# Altium footprint library TranDangKhoa-LIB.PcbLib: 1435 footprints (part 2 of 90)
Each footprint in its own frame and in the unit in brackets; x right, y up, seen from the top. Pads: shape width x height; smd on the part's side, far side on the other; paste and mask are expansions set on the pad; w line width, h text height; cw(c..) or ccw(c..) is an arc to the next point about the centre after c.
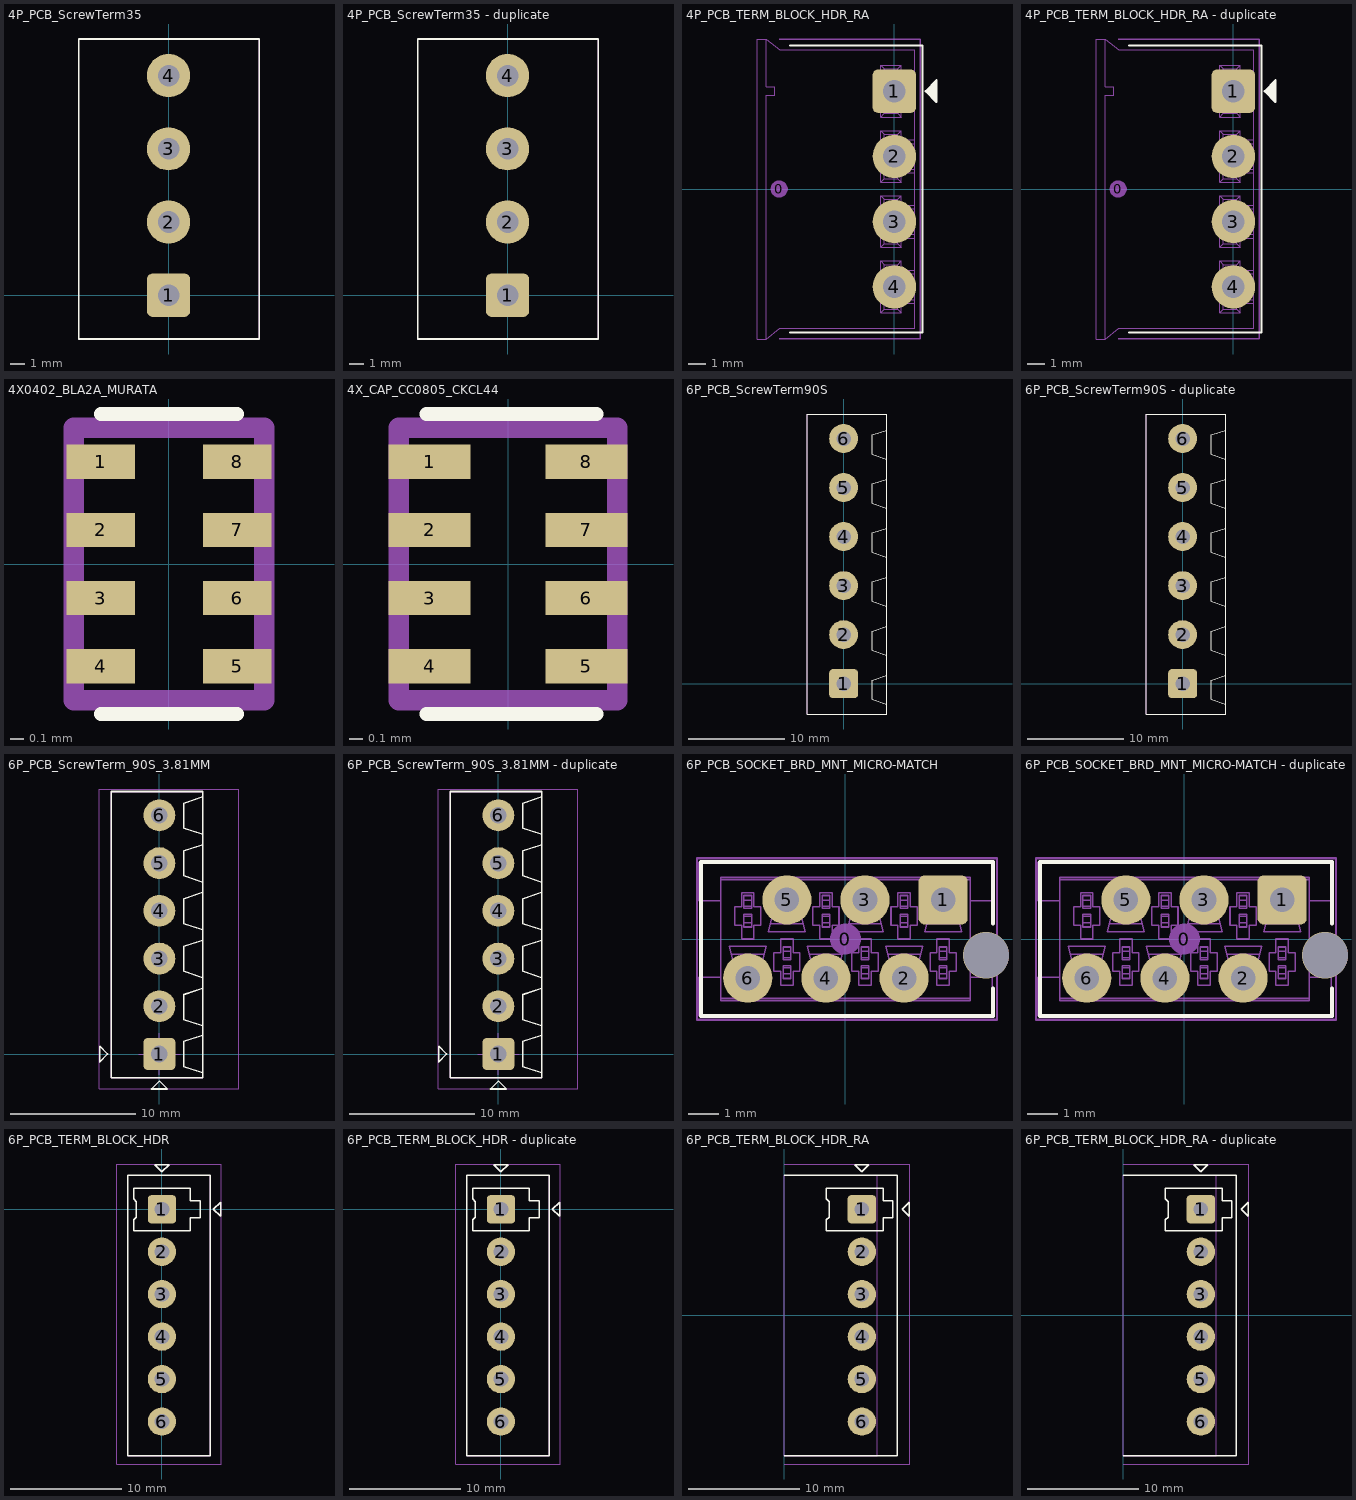
[diagram p1: the footprints below, top view; thin cyan lines are the x and y axes]

## 4P_PCB_ScrewTerm35 [mm] "TERM BLOCK 4POS 35° ENT 5.08MM"
height 15
pads (4):
  rrect25% 3x3 hole 1.5: 1(0,0)
  round 3 hole 1.5: 2(0,5.08) 3(0,10.16) 4(0,15.24)
Top Overlay:
  lines w0.127: -6.231,-3.04 6.289,-3.04 6.289,17.78 -6.231,17.78 -6.231,-3.04
Mechanical 13:
  lines w0.076: -6.231,-3.04 -6.231,17.78 6.289,17.78 6.289,-3.04 -6.231,-3.04
3D body "c-282847-4-d1-3d.stp": height 15.04, standoff -3.76, extent -6.231,-3.04 6.289,17.78

## 4P_PCB_ScrewTerm35 - duplicate [mm] "TERM BLOCK 4POS 35° ENT 5.08MM"
height 15
pads (4):
  rrect25% 3x3 hole 1.5: 1(0,0)
  round 3 hole 1.5: 2(0,5.08) 3(0,10.16) 4(0,15.24)
Top Overlay:
  lines w0.127: -6.231,-3.04 -6.231,17.78 6.289,17.78 6.289,-3.04 -6.231,-3.04
Mechanical 13:
  lines w0.076: -6.231,-3.04 6.289,-3.04 6.289,17.78 -6.231,17.78 -6.231,-3.04
3D body "c-282847-4-d1-3d.stp": height 15.04, standoff -3.76, extent -6.231,-3.04 6.289,17.78

## 4P_PCB_TERM_BLOCK_HDR_RA [mil] "TERM BLOCK HDR 4POS 3.81MM RIGHT-ANGLE"
height 362.2
pads (5):
  round 40 on Mech15: 0(-265,0)
  rrect25% 100x100 hole 52: 1(0,225)
  round 100 hole 52: 2(0,75) 3(0,-75) 4(0,-225)
Top Overlay:
  region: 72,225 97,250 97,200
  lines w5: -240,-330 65,-330 65,330 -240,330 ; 72,225 97,200 97,250 72,225
Mechanical 13:
  lines w1.97: 47.24,-262.8 7.87,-262.8 ; 47.24,-254.53 16.14,-254.53 ; 47.24,-195.47 16.14,-195.47 ; 47.24,-187.2 7.87,-187.2 ; 47.24,-112.8 7.87,-112.8 ; 47.24,-104.53 16.14,-104.53 ; 47.24,-45.47 16.14,-45.47 ; 47.24,-37.2 7.87,-37.2 ; 47.24,37.2 7.87,37.2 ; 47.24,45.47 16.14,45.47 ; 47.24,104.53 16.14,104.53 ; 47.24,112.8 7.87,112.8 ; 47.24,187.2 7.87,187.2 ; 47.24,195.47 16.14,195.47 ; 47.24,254.53 16.14,254.53 ; 47.24,262.8 7.87,262.8 ; -295.28,-345.08 -263.78,-319.88 47.24,-319.88 47.24,319.88 -263.78,319.88 -295.28,345.08 ; -295.28,-345.08 -295.28,215.16 -275.59,215.16 -275.59,234.84 -295.28,234.84 -295.28,345.08 ; -295.28,-345.08 -314.96,-345.08 -314.96,345.08 -295.28,345.08 ; -31.89,-284.45 -31.89,-165.55 ; -31.89,-284.45 -23.62,-276.18 ; -31.89,-284.45 16.14,-284.45 ; -31.89,-165.55 -23.62,-173.82 ; -31.89,-165.55 16.14,-165.55 ; -31.89,-134.45 -23.62,-126.18 ; -31.89,-134.45 16.14,-134.45 ; -31.89,-134.45 -31.89,-15.55 ; -31.89,-15.55 -23.62,-23.82 ; -31.89,-15.55 16.14,-15.55 ; -31.89,15.55 -23.62,23.82 ; -31.89,15.55 16.14,15.55 ; -31.89,15.55 -31.89,134.45 ; -31.89,134.45 -23.62,126.18 ; -31.89,134.45 16.14,134.45 ; -31.89,165.55 -23.62,173.82 ; -31.89,165.55 16.14,165.55 ; -31.89,165.55 -31.89,284.45 ; -31.89,284.45 -23.62,276.18 ; -31.89,284.45 16.14,284.45 ; -23.62,-276.18 -23.62,-173.82 ; -23.62,-276.18 7.87,-276.18 ; -23.62,-173.82 7.87,-173.82 ; -23.62,-126.18 7.87,-126.18 ; -23.62,-126.18 -23.62,-23.82 ; -23.62,-23.82 7.87,-23.82 ; -23.62,23.82 -23.62,126.18 ; -23.62,23.82 7.87,23.82 ; -23.62,126.18 7.87,126.18 ; -23.62,173.82 -23.62,276.18 ; -23.62,173.82 7.87,173.82 ; -23.62,276.18 7.87,276.18 ; 7.87,-276.18 7.87,-262.8 ; 7.87,-276.18 16.14,-284.45 ; 7.87,-262.8 cw(c16.14,-262.8) 16.14,-254.53 ; 7.87,-187.2 ccw(c16.14,-187.2) 16.14,-195.47 ; 7.87,-187.2 7.87,-173.82 ; 7.87,-173.82 16.14,-165.55 ; 7.87,-126.18 7.87,-112.8 ; 7.87,-126.18 16.14,-134.45 ; 7.87,-112.8 cw(c16.14,-112.8) 16.14,-104.53 ; 7.87,-37.2 ccw(c16.14,-37.2) 16.14,-45.47 ; 7.87,-37.2 7.87,-23.82 ; 7.87,-23.82 16.14,-15.55 ; 7.87,23.82 7.87,37.2 ; 7.87,23.82 16.14,15.55 ; 7.87,37.2 cw(c16.14,37.2) 16.14,45.47 ; 7.87,112.8 ccw(c16.14,112.8) 16.14,104.53 ; 7.87,112.8 7.87,126.18 ; 7.87,126.18 16.14,134.45 ; 7.87,173.82 7.87,187.2 ; 7.87,173.82 16.14,165.55 ; 7.87,187.2 cw(c16.14,187.2) 16.14,195.47 ; 7.87,262.8 ccw(c16.14,262.8) 16.14,254.53 ; 7.87,262.8 7.87,276.18 ; 7.87,276.18 16.14,284.45 ; 16.14,-284.45 16.14,-254.53 ; 16.14,-195.47 16.14,-165.55 ; 16.14,-134.45 16.14,-104.53 ; 16.14,-45.47 16.14,-15.55 ; 16.14,15.55 16.14,45.47 ; 16.14,104.53 16.14,134.45 ; 16.14,165.55 16.14,195.47 ; 16.14,254.53 16.14,284.45
Mechanical 15:
  lines w3: -265,-345 60,-345 60,345 -265,345
3D body "CONN RA HEADER TE 4P.STEP": height 291.34, standoff -129.92, extent -314.95,-345.07 47.25,345.08

## 4P_PCB_TERM_BLOCK_HDR_RA - duplicate [mil] "TERM BLOCK HDR 4POS 3.81MM RIGHT-ANGLE"
height 362.2
pads (5):
  round 40 on Mech15: 0(-265,0)
  rrect25% 100x100 hole 52: 1(0,225)
  round 100 hole 52: 2(0,75) 3(0,-75) 4(0,-225)
Top Overlay:
  region: 72,225 97,250 97,200
  lines w5: -240,-330 65,-330 65,330 -240,330 ; 72,225 97,200 97,250 72,225
Mechanical 13:
  lines w1.97: 47.24,-262.8 7.87,-262.8 ; 47.24,-254.53 16.14,-254.53 ; 47.24,-195.47 16.14,-195.47 ; 47.24,-187.2 7.87,-187.2 ; 47.24,-112.8 7.87,-112.8 ; 47.24,-104.53 16.14,-104.53 ; 47.24,-45.47 16.14,-45.47 ; 47.24,-37.2 7.87,-37.2 ; 47.24,37.2 7.87,37.2 ; 47.24,45.47 16.14,45.47 ; 47.24,104.53 16.14,104.53 ; 47.24,112.8 7.87,112.8 ; 47.24,187.2 7.87,187.2 ; 47.24,195.47 16.14,195.47 ; 47.24,254.53 16.14,254.53 ; 47.24,262.8 7.87,262.8 ; -295.28,-345.08 -263.78,-319.88 47.24,-319.88 47.24,319.88 -263.78,319.88 -295.28,345.08 ; -295.28,-345.08 -295.28,215.16 -275.59,215.16 -275.59,234.84 -295.28,234.84 -295.28,345.08 ; -295.28,-345.08 -314.96,-345.08 -314.96,345.08 -295.28,345.08 ; -31.89,-284.45 -31.89,-165.55 ; -31.89,-284.45 -23.62,-276.18 ; -31.89,-284.45 16.14,-284.45 ; -31.89,-165.55 -23.62,-173.82 ; -31.89,-165.55 16.14,-165.55 ; -31.89,-134.45 -23.62,-126.18 ; -31.89,-134.45 16.14,-134.45 ; -31.89,-134.45 -31.89,-15.55 ; -31.89,-15.55 -23.62,-23.82 ; -31.89,-15.55 16.14,-15.55 ; -31.89,15.55 -23.62,23.82 ; -31.89,15.55 16.14,15.55 ; -31.89,15.55 -31.89,134.45 ; -31.89,134.45 -23.62,126.18 ; -31.89,134.45 16.14,134.45 ; -31.89,165.55 -23.62,173.82 ; -31.89,165.55 16.14,165.55 ; -31.89,165.55 -31.89,284.45 ; -31.89,284.45 -23.62,276.18 ; -31.89,284.45 16.14,284.45 ; -23.62,-276.18 -23.62,-173.82 ; -23.62,-276.18 7.87,-276.18 ; -23.62,-173.82 7.87,-173.82 ; -23.62,-126.18 7.87,-126.18 ; -23.62,-126.18 -23.62,-23.82 ; -23.62,-23.82 7.87,-23.82 ; -23.62,23.82 -23.62,126.18 ; -23.62,23.82 7.87,23.82 ; -23.62,126.18 7.87,126.18 ; -23.62,173.82 -23.62,276.18 ; -23.62,173.82 7.87,173.82 ; -23.62,276.18 7.87,276.18 ; 7.87,-276.18 7.87,-262.8 ; 7.87,-276.18 16.14,-284.45 ; 7.87,-262.8 cw(c16.14,-262.8) 16.14,-254.53 ; 7.87,-187.2 ccw(c16.14,-187.2) 16.14,-195.47 ; 7.87,-187.2 7.87,-173.82 ; 7.87,-173.82 16.14,-165.55 ; 7.87,-126.18 7.87,-112.8 ; 7.87,-126.18 16.14,-134.45 ; 7.87,-112.8 cw(c16.14,-112.8) 16.14,-104.53 ; 7.87,-37.2 ccw(c16.14,-37.2) 16.14,-45.47 ; 7.87,-37.2 7.87,-23.82 ; 7.87,-23.82 16.14,-15.55 ; 7.87,23.82 7.87,37.2 ; 7.87,23.82 16.14,15.55 ; 7.87,37.2 cw(c16.14,37.2) 16.14,45.47 ; 7.87,112.8 ccw(c16.14,112.8) 16.14,104.53 ; 7.87,112.8 7.87,126.18 ; 7.87,126.18 16.14,134.45 ; 7.87,173.82 7.87,187.2 ; 7.87,173.82 16.14,165.55 ; 7.87,187.2 cw(c16.14,187.2) 16.14,195.47 ; 7.87,262.8 ccw(c16.14,262.8) 16.14,254.53 ; 7.87,262.8 7.87,276.18 ; 7.87,276.18 16.14,284.45 ; 16.14,-284.45 16.14,-254.53 ; 16.14,-195.47 16.14,-165.55 ; 16.14,-134.45 16.14,-104.53 ; 16.14,-45.47 16.14,-15.55 ; 16.14,15.55 16.14,45.47 ; 16.14,104.53 16.14,134.45 ; 16.14,165.55 16.14,195.47 ; 16.14,254.53 16.14,284.45
Mechanical 15:
  lines w3: -265,-345 60,-345 60,345 -265,345
3D body "CONN RA HEADER TE 4P.STEP": height 291.34, standoff -129.92, extent -314.95,-345.07 47.25,345.08

## 4X0402_BLA2A_MURATA [mm]
pads (8):
  rect 0.5x0.25 smd mask+0.025: 1(-0.5,0.75) 2(-0.5,0.25) 3(-0.5,-0.25) 4(-0.5,-0.75) 5(0.5,-0.75) 6(0.5,-0.25) 7(0.5,0.25) 8(0.5,0.75)
Top Overlay:
  lines w0.1: -0.5,-1.1 0.5,-1.1 ; -0.5,1.1 0.5,1.1
Mechanical 16:
  lines w0.15: -0.7,-1 0.7,-1 0.7,1 -0.7,1 -0.7,-1
Mechanical 29:
  text ".Designator" at 0.2,-0.7 h0.4
3D body: height 0.5, standoff 0, extent -0.5,-1 0.5,1

## 4X_CAP_CC0805_CKCL44 [mm]
pads (8):
  rect 0.6x0.25 smd mask+0.025: 1(-0.575,0.75) 2(-0.575,0.25) 3(-0.575,-0.25) 4(-0.575,-0.75) 5(0.575,-0.75) 6(0.575,-0.25) 7(0.575,0.25) 8(0.575,0.75)
Top Overlay:
  lines w0.1: -0.6,-1.1 0.65,-1.1 ; -0.6,1.1 0.65,1.1
Mechanical 16:
  lines w0.15: -0.8,-1 -0.8,1 0.8,1 0.8,-1 -0.8,-1
Mechanical 29:
  text ".Designator" at -0.2,0.7 h0.4
3D body: height 1, standoff 0, extent -0.7,-1 0.7,1

## 6P_PCB_ScrewTerm90S [mm] "TERM BLOCK 6POS SIDE ENT STACKABLE 5.08MM"
height 10
pads (6):
  rrect25% 3x3 hole 1.5: 1(0,0)
  round 3 hole 1.5: 2(0,5.08) 3(0,10.16) 4(0,15.24) 5(0,20.32) 6(0,25.4)
Top Overlay:
  lines w0.127: 4.45,-2.124 2.95,-1.624 2.95,0.376 4.45,0.876 ; 4.45,2.956 2.95,3.456 2.95,5.456 4.45,5.956 ; 4.45,8.036 2.95,8.536 2.95,10.536 4.45,11.036 ; 4.45,13.116 2.95,13.616 2.95,15.616 4.45,16.116 ; 4.45,18.196 2.95,18.696 2.95,20.696 4.45,21.196 ; 4.45,23.276 2.95,23.776 2.95,25.776 4.45,26.276 ; -3.75,-3.14 -3.75,27.94 4.45,27.94 4.45,-3.14 -3.75,-3.14
Mechanical 13:
  lines w0.076: -3.75,-3.14 -3.75,27.94 4.45,27.94 4.45,-3.14 -3.75,-3.14
3D body "c-1776119-6-b-3d.stp": height 10.02, standoff -2.58, extent -3.75,-3.14 4.45,27.94

## 6P_PCB_ScrewTerm90S - duplicate [mm] "TERM BLOCK 6POS SIDE ENT STACKABLE 5.08MM"
height 10
pads (6):
  rrect25% 3x3 hole 1.5: 1(0,0)
  round 3 hole 1.5: 2(0,5.08) 3(0,10.16) 4(0,15.24) 5(0,20.32) 6(0,25.4)
Top Overlay:
  lines w0.127: 4.45,-2.124 2.95,-1.624 2.95,0.376 4.45,0.876 ; 4.45,2.956 2.95,3.456 2.95,5.456 4.45,5.956 ; 4.45,8.036 2.95,8.536 2.95,10.536 4.45,11.036 ; 4.45,13.116 2.95,13.616 2.95,15.616 4.45,16.116 ; 4.45,18.196 2.95,18.696 2.95,20.696 4.45,21.196 ; 4.45,23.276 2.95,23.776 2.95,25.776 4.45,26.276 ; -3.75,-3.14 -3.75,27.94 4.45,27.94 4.45,-3.14 -3.75,-3.14
Mechanical 13:
  lines w0.076: -3.75,-3.14 -3.75,27.94 4.45,27.94 4.45,-3.14 -3.75,-3.14
3D body "c-1776119-6-b-3d.stp": height 10.02, standoff -2.58, extent -3.75,-3.14 4.45,27.94

## 6P_PCB_ScrewTerm_90S_3.81MM [mil] "TERM BLOCK 6POS SIDE ENT STACKABLE 3.81MM"
height 334.65
pads (6):
  rrect25% 100x100 hole 52: 1(0,0)
  round 100 hole 52: 2(0,150) 3(0,300) 4(0,450) 5(0,600) 6(0,750)
Top Overlay:
  lines w5: 135.83,-59.06 76.78,-39.37 76.78,39.37 135.83,59.06 ; 135.83,88.58 76.78,108.27 76.78,187.01 135.83,206.69 ; 135.83,240 76.78,259.69 76.78,338.43 135.83,358.11 ; 135.83,390 76.78,409.69 76.78,488.43 135.83,508.11 ; 135.83,540 76.78,559.68 76.78,638.43 135.83,658.11 ; 135.83,690 76.78,709.68 76.78,788.43 135.83,808.11 ; -188,-25 -188,25 -163,0 -188,-25 ; -151.57,-75 135.83,-75 135.83,825 -151.57,825 -151.57,-75 ; -25,-110 0,-85 25,-110 -25,-110
Mechanical 13:
  lines w3: -151.57,-75 -151.57,825 135.83,825 135.83,-75 -151.57,-75
Mechanical 15:
  lines w3: -65,0 65,0 ; 0,-65 0,65 ; -190,-110 250,-110 250,832.88 -190,832.88 -190,-110
3D body "c-1776113-6-o-3d.stp": height 335.25, standoff -137.2, extent -151.57,-75 135.83,825

## 6P_PCB_ScrewTerm_90S_3.81MM - duplicate [mil] "TERM BLOCK 6POS SIDE ENT STACKABLE 3.81MM"
height 334.65
pads (6):
  rrect25% 100x100 hole 52: 1(0,0)
  round 100 hole 52: 2(0,150) 3(0,300) 4(0,450) 5(0,600) 6(0,750)
Top Overlay:
  lines w5: 135.83,-59.06 76.78,-39.37 76.78,39.37 135.83,59.06 ; 135.83,88.58 76.78,108.27 76.78,187.01 135.83,206.69 ; 135.83,240 76.78,259.69 76.78,338.43 135.83,358.11 ; 135.83,390 76.78,409.69 76.78,488.43 135.83,508.11 ; 135.83,540 76.78,559.68 76.78,638.43 135.83,658.11 ; 135.83,690 76.78,709.68 76.78,788.43 135.83,808.11 ; -188,-25 -188,25 -163,0 -188,-25 ; -151.57,-75 135.83,-75 135.83,825 -151.57,825 -151.57,-75 ; -25,-110 0,-85 25,-110 -25,-110
Mechanical 13:
  lines w3: -151.57,-75 -151.57,825 135.83,825 135.83,-75 -151.57,-75
Mechanical 15:
  lines w3: -65,0 65,0 ; 0,-65 0,65 ; -190,-110 250,-110 250,832.88 -190,832.88 -190,-110
3D body "c-1776113-6-o-3d.stp": height 335.25, standoff -137.2, extent -151.57,-75 135.83,825

## 6P_PCB_SOCKET_BRD_MNT_MICRO-MATCH [mm] "SOCKET MICRO-MATCH BRD MNT 6POS 2.54MM"
height 4.2
pads (7):
  round 1.016 on Mech15: 0(0,0)
  rrect25% 1.6x1.6 hole 0.8: 1(3.175,1.27)
  round 1.6 hole 0.8: 2(1.905,-1.27) 3(0.635,1.27) 4(-0.635,-1.27) 5(-1.905,1.27) 6(-3.175,-1.27)
via 4.575,-0.53 diameter 1.5 hole 1.473
Top Overlay:
  lines w0.127: 4.8,-1.6 4.8,-2.5 -4.7,-2.5 -4.7,2.5 4.8,2.5 4.8,0.5
Mechanical 13:
  drawing of 280 lines, arcs and shapes, not listed
Mechanical 15:
  lines w0.076: -4.827,-2.627 4.927,-2.627 4.927,2.627 -4.827,2.627 -4.827,-2.627
3D body "Micro-Match 6-pin header 7-215079-6.STEP": height 4, standoff -3, extent -4.775,-2.5 4.775,2.5

## 6P_PCB_SOCKET_BRD_MNT_MICRO-MATCH - duplicate [mm] "SOCKET MICRO-MATCH BRD MNT 6POS 2.54MM"
height 4.2
pads (7):
  round 1.016 on Mech15: 0(0,0)
  rrect25% 1.6x1.6 hole 0.8: 1(3.175,1.27)
  round 1.6 hole 0.8: 2(1.905,-1.27) 3(0.635,1.27) 4(-0.635,-1.27) 5(-1.905,1.27) 6(-3.175,-1.27)
via 4.575,-0.53 diameter 1.5 hole 1.473
Top Overlay:
  lines w0.127: 4.8,-1.6 4.8,-2.5 -4.7,-2.5 -4.7,2.5 4.8,2.5 4.8,0.5
Mechanical 13:
  drawing of 280 lines, arcs and shapes, not listed
Mechanical 15:
  lines w0.076: -4.827,-2.627 4.927,-2.627 4.927,2.627 -4.827,2.627 -4.827,-2.627
3D body "Micro-Match 6-pin header 7-215079-6.STEP": height 4, standoff -3, extent -4.775,-2.5 4.775,2.5

## 6P_PCB_TERM_BLOCK_HDR [mil] "TERM BLOCK HDR 6POS 3.81MM"
height 362.2
pads (6):
  rrect25% 100x100 hole 52: 1(0,0)
  round 100 hole 52: 2(0,-150) 3(0,-300) 4(0,-450) 5(0,-600) 6(0,-750)
Top Overlay:
  lines w5: -120,-870 -120,120 170,120 170,-870 -120,-870 ; -100,-75 -100,-37.5 -90,-27.5 -90,27.5 -100,37.5 -100,75 100,75 100,30 135,30 135,-30 100,-30 100,-75 -100,-75 ; -25,157 25,157 0,132 -25,157 ; 182,0 207,-25 207,25 182,0
Mechanical 13:
  lines w3: -120,-870 170,-870 170,120 -120,120 -120,-870
Mechanical 15:
  lines w3: -160,-900 -160,160 210,160 210,-900 -160,-900
3D body: height 362.2, standoff 0, extent -120,-870 170,120
3D body "c-0284517-06-c-3d.stp": height 362.8, standoff -133.26, extent -118.11,-870.07 167.33,120.08

## 6P_PCB_TERM_BLOCK_HDR - duplicate [mil] "TERM BLOCK HDR 6POS 3.81MM"
height 362.2
pads (6):
  rrect25% 100x100 hole 52: 1(0,0)
  round 100 hole 52: 2(0,-150) 3(0,-300) 4(0,-450) 5(0,-600) 6(0,-750)
Top Overlay:
  lines w5: -120,-870 -120,120 170,120 170,-870 -120,-870 ; -100,-75 -100,-37.5 -90,-27.5 -90,27.5 -100,37.5 -100,75 100,75 100,30 135,30 135,-30 100,-30 100,-75 -100,-75 ; -25,157 25,157 0,132 -25,157 ; 182,0 207,-25 207,25 182,0
Mechanical 13:
  lines w3: -120,-870 170,-870 170,120 -120,120 -120,-870
Mechanical 15:
  lines w3: -160,-900 -160,160 210,160 210,-900 -160,-900
3D body: height 362.2, standoff 0, extent -120,-870 170,120
3D body "c-0284517-06-c-3d.stp": height 362.8, standoff -133.26, extent -118.11,-870.07 167.33,120.08

## 6P_PCB_TERM_BLOCK_HDR_RA [mil] "TERM BLOCK HDR 6POS 3.81MM RIGHT-ANGLE"
height 362.2
pads (6):
  rrect25% 100x100 hole 52: 1(275,375)
  round 100 hole 52: 2(275,225) 3(275,75) 4(275,-75) 5(275,-225) 6(275,-375)
Top Overlay:
  lines w5: 0,-495 400,-495 400,495 0,495 ; 150,300 150,337.5 160,347.5 160,402.5 150,412.5 150,450 350,450 350,405 385,405 385,345 350,345 350,300 150,300 ; 250,532 300,532 275,507 250,532 ; 417,375 442,350 442,400 417,375
Mechanical 13:
  lines w3: 0,-495 330,-495 330,495 0,495 0,-495
Mechanical 15:
  lines w3: 0,-525 445,-525 445,535 0,535
3D body "c-284513-6-c-3d.stp": height 288, standoff -133.26, extent -40,-495.08 322.2,495.08

## 6P_PCB_TERM_BLOCK_HDR_RA - duplicate [mil] "TERM BLOCK HDR 6POS 3.81MM RIGHT-ANGLE"
height 362.2
pads (6):
  rrect25% 100x100 hole 52: 1(275,375)
  round 100 hole 52: 2(275,225) 3(275,75) 4(275,-75) 5(275,-225) 6(275,-375)
Top Overlay:
  lines w5: 0,-495 400,-495 400,495 0,495 ; 150,300 350,300 350,345 385,345 385,405 350,405 350,450 150,450 150,412.5 160,402.5 160,347.5 150,337.5 150,300 ; 250,532 275,507 300,532 250,532 ; 417,375 442,400 442,350 417,375
Mechanical 13:
  lines w3: 0,-495 0,495 330,495 330,-495 0,-495
Mechanical 15:
  lines w3: 0,-525 445,-525 445,535 0,535
3D body "c-284513-6-c-3d.stp": height 288, standoff -133.26, extent -40,-495.08 322.2,495.08